# Altium footprint library TransformersTHD.PcbLib: 35 footprints (part 3 of 3)
Each footprint in its own frame and in the unit in brackets; x right, y up, seen from the top. Pads: shape width x height; smd on the part's side, far side on the other; paste and mask are expansions set on the pad; w line width, h text height; cw(c..) or ccw(c..) is an arc to the next point about the centre after c.
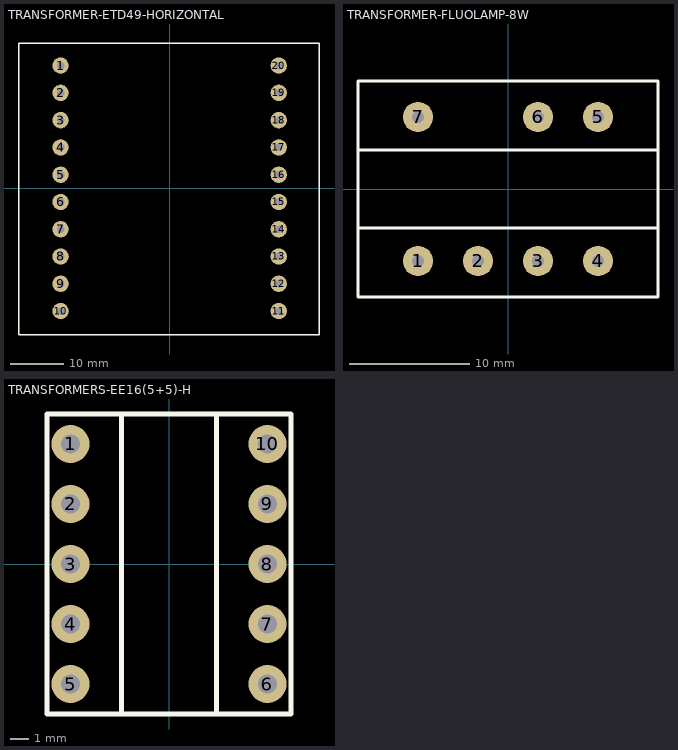
[diagram p2: the footprints below, top view; thin cyan lines are the x and y axes]

## TRANSFORMER-ETD49-HORIZONTAL [mil]
pads (20):
  round 120 hole 55: 1(-800,900) 2(-800,700) 3(-800,500) 4(-800,300) 5(-800,100) 6(-800,-100) 7(-800,-300) 8(-800,-500) 9(-800,-700) 10(-800,-900) 11(800,-900) 12(800,-700) 13(800,-500) 14(800,-300) 15(800,-100) 16(800,100) 17(800,300) 18(800,500) 19(800,700) 20(800,900)
Top Overlay:
  lines w10: -1105,-1075 -1105,1065 1095,1065 1095,-1075 -1105,-1075
3D body "ETD49 Horizontal v3.step": height 1612.73, standoff -196.04, extent -1096.77,-1068.36 1100.08,1069.43

## TRANSFORMER-FLUOLAMP-8W [mm]
pads (7):
  round 2.54 hole 1.016: 1(-7.5,-6) 2(-2.5,-6) 3(2.5,-6) 4(7.5,-6) 5(7.5,6) 6(2.5,6) 7(-7.5,6)
Top Overlay:
  lines w0.254: -12.5,-3.25 12.5,-3.25 ; -12.5,3.25 12.5,3.25 ; -12.5,-9 -12.5,9 12.5,9 12.5,-9 -12.5,-9

## TRANSFORMERS-EE16(5+5)-H [mil]
pads (10):
  round 80 hole 40: 1(-206.69,251.97) 2(-206.69,125.98) 3(-206.69,0) 4(-206.69,-125.98) 5(-206.69,-251.97) 6(206.69,-251.97) 7(206.69,-125.98) 8(206.69,0) 9(206.69,125.98) 10(206.69,251.97)
Top Overlay:
  lines w10: -100,-314.96 -100,314.96 ; 100,-314.96 100,314.96 ; -255.91,-314.96 255.91,-314.96 255.91,314.96 -255.91,314.96 -255.91,-314.96
3D body "User Library-EE16(5+5).STEP": height 572.83, standoff -157.48, extent -253.93,-318.89 254.92,318.9